# Altium footprint library RSX_Modules.PcbLib: 5 footprints
Each footprint in its own frame and in the unit in brackets; x right, y up, seen from the top. Pads: shape width x height; smd on the part's side, far side on the other; paste and mask are expansions set on the pad; w line width, h text height; cw(c..) or ccw(c..) is an arc to the next point about the centre after c.
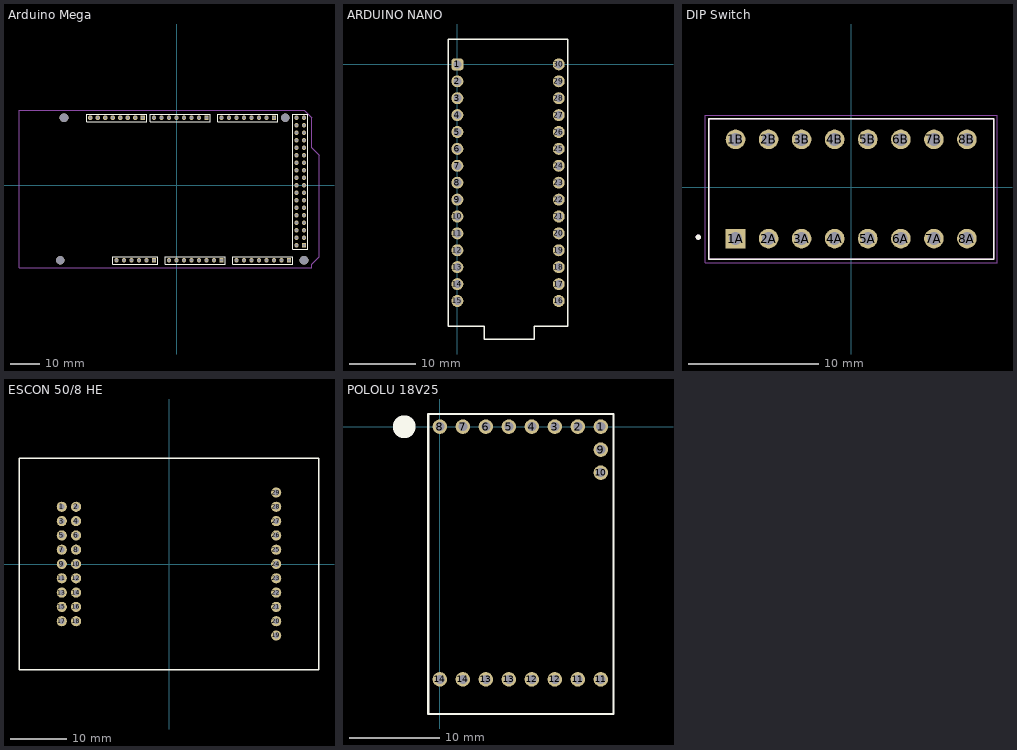
[diagram p0: the footprints below, top view; thin cyan lines are the x and y axes]

## Arduino Mega [mm] "Arduino Mega 2560"
pads (82):
  rect 1.5x1.5 hole 0.9: 0(10.16,22.86) 8(-11.43,22.86) 21(33.02,22.86) 59(-7.62,-25.4) 67(15.24,-25.4) 75(38.1,-25.4) 79(43.18,-20.32)
  round 1.5 hole 0.9: 1(7.62,22.86) 2(5.08,22.86) 3(2.54,22.86) 4(0,22.86) 5(-2.54,22.86) 6(-5.08,22.86) 7(-7.62,22.86) 9(-13.97,22.86) 10(-16.51,22.86) 11(-19.05,22.86) 12(-21.59,22.86) 13(-24.13,22.86) 14(15.24,22.86) 15(17.78,22.86) 16(20.32,22.86) 17(22.86,22.86) 18(25.4,22.86) 19(27.94,22.86) 20(30.48,22.86) 22(40.64,20.32) 23(43.18,20.32) 24(40.64,17.78) 25(43.18,17.78) 26(40.64,15.24) 27(43.18,15.24) 28(40.64,12.7) 29(43.18,12.7) 30(40.64,10.16) 31(43.18,10.16) 32(40.64,7.62) 33(43.18,7.62) 34(40.64,5.08) 35(43.18,5.08) 36(40.64,2.54) 37(43.18,2.54) 38(40.64,0) 39(43.18,0) 40(40.64,-2.54) 41(43.18,-2.54) 42(40.64,-5.08) 43(43.18,-5.08) 44(40.64,-7.62) 45(43.18,-7.62) 46(40.64,-10.16) 47(43.18,-10.16) 48(40.64,-12.7) 49(43.18,-12.7) 50(40.64,-15.24) 51(43.18,-15.24) 52(40.64,-17.78) 53(43.18,-17.78) 54(-20.32,-25.4) 55(-17.78,-25.4) 56(-15.24,-25.4) 57(-12.7,-25.4) 58(-10.16,-25.4) 60(-2.54,-25.4) 61(0,-25.4) 62(2.54,-25.4) 63(5.08,-25.4) 64(7.62,-25.4) 65(10.16,-25.4) 66(12.7,-25.4) 68(20.32,-25.4) 69(22.86,-25.4) 70(25.4,-25.4) 71(27.94,-25.4) 72(30.48,-25.4) 73(33.02,-25.4) 74(35.56,-25.4) 76(-26.67,22.86) 77(-29.21,22.86) 78(40.64,-20.32) 80(43.18,22.86) 81(40.64,22.86)
via -39.37,-25.4 diameter 3 hole 3
via -38.1,22.86 diameter 3 hole 3
via 36.83,22.86 diameter 3 hole 3
via 43.18,-25.4 diameter 3 hole 3
Top Overlay:
  lines w0.2: -30.48,21.59 -30.48,24.13 -10.16,24.13 -10.16,21.59 -30.48,21.59 ; -21.59,-26.67 -6.35,-26.67 -6.35,-24.13 -21.59,-24.13 -21.59,-26.67 ; -8.89,21.59 -8.89,24.13 11.43,24.13 11.43,21.59 -8.89,21.59 ; -3.81,-26.67 -3.81,-24.13 16.51,-24.13 16.51,-26.67 -3.81,-26.67 ; 13.97,21.59 34.29,21.59 34.29,24.13 13.97,24.13 13.97,21.59 ; 19.05,-26.67 19.05,-24.13 39.37,-24.13 39.37,-26.67 19.05,-26.67 ; 39.37,-21.59 39.37,24.13 44.45,24.13 44.45,-21.59 39.37,-21.59
Mechanical 1:
  lines w0.254: 45.72,12.69 48.26,10.15 48.26,-24.13 45.72,-26.67 45.72,-27.94 -51.7,-27.94 -53.34,-27.94 -53.34,-26.3 -53.34,25.4 43.18,25.4 45.72,22.86 45.72,12.7

## ARDUINO NANO [mm]
pads (30):
  rrect50% 1.8x1.8 hole 1.2: 1(0,0)
  round 1.8 hole 1.2: 2(0,-2.54) 3(0,-5.08) 4(0,-7.62) 5(0,-10.16) 6(0,-12.7) 7(0,-15.24) 8(0,-17.78) 9(0,-20.32) 10(0,-22.86) 11(0,-25.4) 12(0,-27.94) 13(0,-30.48) 14(0,-33.02) 15(0,-35.56) 16(15.24,-35.56) 17(15.24,-33.02) 18(15.24,-30.48) 19(15.24,-27.94) 20(15.24,-25.4) 21(15.24,-22.86) 22(15.24,-20.32) 23(15.24,-17.78) 24(15.24,-15.24) 25(15.24,-12.7) 26(15.24,-10.16) 27(15.24,-7.62) 28(15.24,-5.08) 29(15.24,-2.54) 30(15.24,0)
Top Overlay:
  lines w0.2: -1.397,-39.37 4.064,-39.37 4.064,-41.275 11.557,-41.275 11.557,-39.37 16.62,-39.37 16.62,3.82 -1.38,3.82 -1.38,-39.37
3D body "arduino nano.STEP": height 12.61, standoff -5.99, extent -1.38,-41.18 16.62,3.82

## DIP Switch [mm] "8 position SPST DIP Switch"
pads (16):
  rect 1.508x1.508 hole 1: 1A(-8.89,-3.937)
  round 1.508 hole 1: 1B(-8.89,3.683) 2A(-6.35,-3.937) 2B(-6.35,3.683) 3A(-3.81,-3.937) 3B(-3.81,3.683) 4A(-1.27,-3.937) 4B(-1.27,3.683) 5A(1.27,-3.937) 5B(1.27,3.683) 6A(3.81,-3.937) 6B(3.81,3.683) 7A(6.35,-3.937) 7B(6.35,3.683) 8A(8.89,-3.937) 8B(8.89,3.683)
Top Overlay:
  circle w0.2: c-11.75,-3.827 r0.1
  lines w0.127: -10.95,-5.527 -10.95,5.273 10.95,5.273 10.95,-5.527 -10.95,-5.527
Mechanical 13:
  circle w0.2: c-11.75,-3.827 r0.1
  lines w0.127: -10.95,-5.527 -10.95,5.273 10.95,5.273 10.95,-5.527 -10.95,-5.527
Mechanical 15:
  lines w0.05: -11.2,-5.777 11.2,-5.777 11.2,5.523 -11.2,5.523 -11.2,-5.777

## ESCON 50/8 HE [mm]
pads (29):
  round 1.8 hole 1: 1(-19.05,10.16) 2(-16.51,10.16) 3(-19.05,7.62) 4(-16.51,7.62) 5(-19.05,5.08) 6(-16.51,5.08) 7(-19.05,2.54) 8(-16.51,2.54) 9(-19.05,0) 10(-16.51,0) 11(-19.05,-2.54) 12(-16.51,-2.54) 13(-19.05,-5.08) 14(-16.51,-5.08) 15(-19.05,-7.62) 16(-16.51,-7.62) 17(-19.05,-10.16) 18(-16.51,-10.16) 19(19.05,-12.7) 20(19.05,-10.16) 21(19.05,-7.62) 22(19.05,-5.08) 23(19.05,-2.54) 24(19.05,0) 25(19.05,2.54) 26(19.05,5.08) 27(19.05,7.62) 28(19.05,10.16) 29(19.05,12.7)
Top Overlay:
  lines w0.254: -26.65,-18.75 -26.65,0 -26.65,18.75 26.65,18.75 26.65,0 26.65,-18.75 -26.65,-18.75

## POLOLU 18V25 [mm]
pads (18):
  round 1.6 hole 1 paste+0: 1(17.78,0) 2(15.24,0) 3(12.7,0) 5(7.62,0) 6(5.08,0) 7(2.54,0) 10(17.78,-5.08) 11(15.24,-27.92) 11(17.78,-27.92) 12(12.7,-27.92) 13(5.08,-27.92) 13(7.62,-27.92) 14(2.54,-27.92)
  round 1.6 hole 1: 4(10.16,0) 8(0,0) 9(17.78,-2.54) 12(10.16,-27.92) 14(0,-27.92)
Top Overlay:
  circle w2.156: c-3.937,0 r0.18
  lines w0.254: -1.27,-31.75 19.177,-31.75 19.177,1.397 0,1.397 -1.27,1.397 -1.27,-31.75
3D body "g2-high-power-motor-driver-md31b.step": height 9.57, standoff -1, extent -1.27,-31.72 19.05,1.3